# Altium footprint library ProgettoAgrifoodLibreriaPCB.PcbLib: 54 footprints (part 4 of 4)
Each footprint in its own frame and in the unit in brackets; x right, y up, seen from the top. Pads: shape width x height; smd on the part's side, far side on the other; paste and mask are expansions set on the pad; w line width, h text height; cw(c..) or ccw(c..) is an arc to the next point about the centre after c.
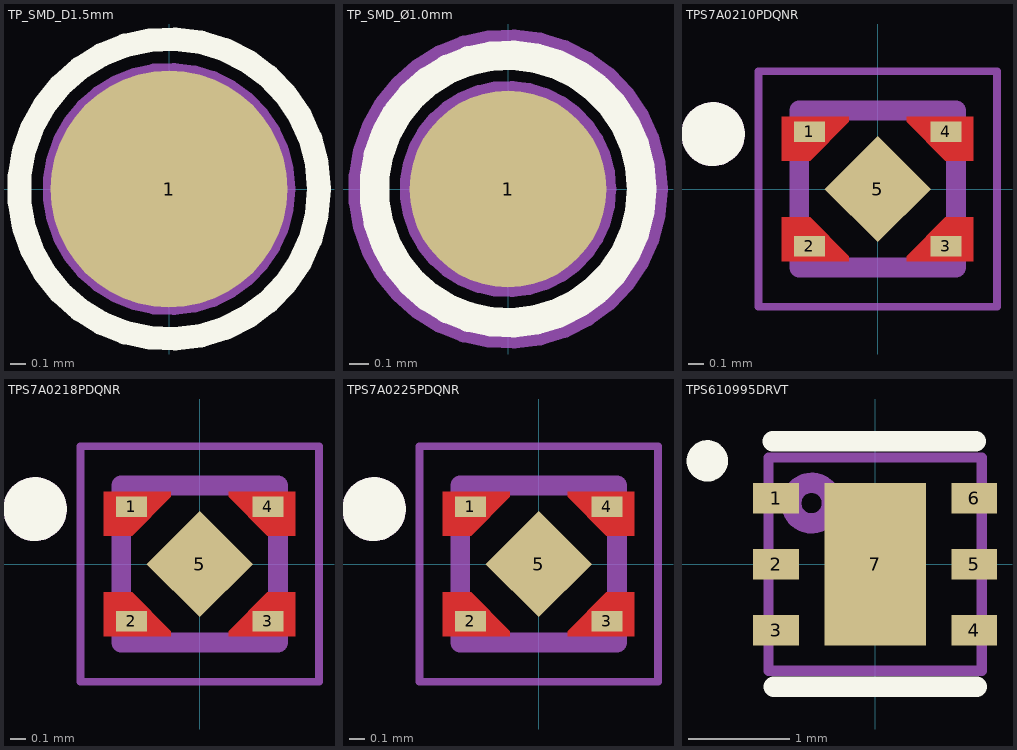
[diagram p3: the footprints below, top view; thin cyan lines are the x and y axes]

## TP_SMD_D1.5mm [mm]
pads (1):
  round 1.5 smd paste-5: 1(0,0)
Top Overlay:
  circle w0.15: c0,0 r0.95
Top Courtyard:
  circle w0.1: c0,0 r0.95
Top Assembly:
  circle w0.1: c0,0 r0.75
  text ".Designator" at -0.9,1.175 h0.38
3D body: height 0.05, standoff 0, extent -0.75,-0.75 0.75,0.75

## TP_SMD_Ø1.0mm [mm]
pads (1):
  round 1 smd paste-5: 1(0,0)
Top Overlay:
  circle w0.15: c0,0 r0.68
Top Courtyard:
  circle w0.1: c0,0 r0.762
Top Assembly:
  circle w0.1: c0,0 r0.5
  text ".Designator" at -0.633,0.918 h0.38

## TPS7A0210PDQNR [mm]
pads (5):
  rect 0.2x0.13 smd paste-1 mask+0: 1(-0.435,0.365) 2(-0.435,-0.365) 3(0.435,-0.365) 4(0.435,0.365)
  rect 0.48x0.48 smd rot 135 paste+0.002 mask+0.051: 5(0,0)
Top Layer:
  region: 0.61,-0.46 0.185,-0.46 0.185,-0.43 0.43,-0.18 0.61,-0.18
  region: 0.61,0.18 0.43,0.18 0.185,0.43 0.185,0.46 0.61,0.46
  region: -0.185,-0.43 -0.185,-0.46 -0.61,-0.46 -0.61,-0.18 -0.43,-0.18
  region: -0.185,0.43 -0.43,0.18 -0.61,0.18 -0.61,0.46 -0.185,0.46
Top Overlay:
  circle w0.203: c-1.05,0.35 r0.102
Top Paste:
  region: -0.605,0.191 -0.605,0.451 -0.205,0.451 -0.205,0.421 -0.435,0.191
  region: 0.601,-0.19 0.601,-0.45 0.201,-0.45 0.201,-0.42 0.431,-0.19
  region: -0.602,-0.192 -0.602,-0.452 -0.202,-0.452 -0.202,-0.422 -0.432,-0.192
  region: 0.603,0.189 0.603,0.45 0.203,0.45 0.203,0.42 0.434,0.189
Top Courtyard:
  lines w0.05: -0.76,-0.75 0.76,-0.75 0.76,0.75 -0.76,0.75 -0.76,-0.75
Top Assembly:
  circle w0.203: c-1.05,0.35 r0.102
  lines w0.127: -0.5,-0.5 0.5,-0.5 0.5,0.5 -0.5,0.5 -0.5,-0.5
  text ".Designator" at -0.809,0.982 h0.8
3D body "DQN0004A.stp": height 0.36, standoff 0, extent -0.5,-0.5 0.5,0.5

## TPS7A0218PDQNR [mm]
pads (5):
  rect 0.2x0.13 smd paste-1 mask+0: 1(-0.435,0.365) 2(-0.435,-0.365) 3(0.435,-0.365) 4(0.435,0.365)
  rect 0.48x0.48 smd rot 135 paste+0.002 mask+0.051: 5(0,0)
Top Layer:
  region: 0.61,-0.46 0.185,-0.46 0.185,-0.43 0.43,-0.18 0.61,-0.18
  region: 0.61,0.18 0.43,0.18 0.185,0.43 0.185,0.46 0.61,0.46
  region: -0.185,-0.43 -0.185,-0.46 -0.61,-0.46 -0.61,-0.18 -0.43,-0.18
  region: -0.185,0.43 -0.43,0.18 -0.61,0.18 -0.61,0.46 -0.185,0.46
Top Overlay:
  circle w0.203: c-1.05,0.35 r0.102
Top Paste:
  region: 0.604,-0.191 0.604,-0.45 0.204,-0.45 0.204,-0.42 0.433,-0.191
  region: -0.603,0.194 -0.603,0.454 -0.203,0.454 -0.203,0.424 -0.432,0.194
  region: 0.602,0.192 0.602,0.453 0.202,0.453 0.202,0.423 0.433,0.192
  region: -0.6,-0.192 -0.6,-0.453 -0.2,-0.453 -0.2,-0.423 -0.431,-0.192
Top Courtyard:
  lines w0.05: -0.76,-0.75 0.76,-0.75 0.76,0.75 -0.76,0.75 -0.76,-0.75
Top Assembly:
  circle w0.203: c-1.05,0.35 r0.102
  lines w0.127: -0.5,-0.5 -0.5,0.5 0.5,0.5 0.5,-0.5 -0.5,-0.5
  text ".Designator" at -0.662,0.875 h0.8
3D body "DQN0004A.stp": height 0.36, standoff 0, extent -0.5,-0.5 0.5,0.5

## TPS7A0225PDQNR [mm]
pads (5):
  rect 0.2x0.13 smd paste-1 mask+0: 1(-0.435,0.365) 2(-0.435,-0.365) 3(0.435,-0.365) 4(0.435,0.365)
  rect 0.48x0.48 smd rot 135 paste+0.002 mask+0.051: 5(0,0)
Top Layer:
  region: -0.185,0.43 -0.43,0.18 -0.61,0.18 -0.61,0.46 -0.185,0.46
  region: -0.185,-0.43 -0.185,-0.46 -0.61,-0.46 -0.61,-0.18 -0.43,-0.18
  region: 0.61,0.18 0.43,0.18 0.185,0.43 0.185,0.46 0.61,0.46
  region: 0.61,-0.46 0.185,-0.46 0.185,-0.43 0.43,-0.18 0.61,-0.18
Top Overlay:
  circle w0.203: c-1.05,0.35 r0.102
Top Paste:
  region: -0.603,0.195 -0.603,0.455 -0.203,0.455 -0.203,0.425 -0.432,0.195
  region: 0.601,-0.192 0.601,-0.452 0.201,-0.452 0.201,-0.422 0.431,-0.192
  region: -0.601,-0.191 -0.601,-0.452 -0.201,-0.452 -0.201,-0.422 -0.432,-0.191
  region: 0.605,0.193 0.605,0.454 0.205,0.454 0.205,0.424 0.435,0.193
Top Courtyard:
  lines w0.05: -0.76,-0.75 -0.76,0.75 0.76,0.75 0.76,-0.75 -0.76,-0.75
Top Assembly:
  circle w0.203: c-1.05,0.35 r0.102
  lines w0.127: -0.5,-0.5 0.5,-0.5 0.5,0.5 -0.5,0.5 -0.5,-0.5
  text ".Designator" at -0.662,0.875 h0.8
3D body "DQN0004A.stp": height 0.36, standoff 0, extent -0.5,-0.5 0.5,0.5

## TPS610995DRVT [mm]
pads (7):
  rect 0.45x0.3 smd paste+0 mask+0.07: 1(-0.975,0.65) 2(-0.975,0) 3(-0.975,-0.65) 4(0.975,-0.65) 5(0.975,0) 6(0.975,0.65)
  rect 1x1.6 smd paste-0.5 mask+0.07: 7(0,0)
Top Overlay:
  circle w0.203: c-1.651,1.016 r0.102
  lines w0.2: -1.009,1.209 0.991,1.209 ; -0.996,-1.208 1.004,-1.208
Top Paste:
  region: -0.499,0.139 -0.5,0.149 -0.5,0.751 -0.499,0.761 -0.496,0.77 -0.492,0.778 -0.486,0.786 -0.478,0.792 -0.47,0.796 -0.461,0.799 -0.451,0.8 0.451,0.8 0.461,0.799 0.47,0.796 0.478,0.792 0.486,0.786 0.492,0.778 0.496,0.77 0.499,0.761 0.5,0.751 0.5,0.149 0.499,0.139 0.496,0.13 0.492,0.122 0.486,0.114 0.478,0.108 0.47,0.104 0.461,0.101 0.451,0.1 -0.451,0.1 -0.461,0.101 -0.47,0.104 -0.478,0.108 -0.486,0.114 -0.492,0.122 -0.496,0.13
  region: -0.499,-0.761 -0.5,-0.751 -0.5,-0.149 -0.499,-0.139 -0.496,-0.13 -0.492,-0.122 -0.486,-0.114 -0.478,-0.108 -0.47,-0.104 -0.461,-0.101 -0.451,-0.1 0.451,-0.1 0.461,-0.101 0.47,-0.104 0.478,-0.108 0.486,-0.114 0.492,-0.122 0.496,-0.13 0.499,-0.139 0.5,-0.149 0.5,-0.751 0.499,-0.761 0.496,-0.77 0.492,-0.778 0.486,-0.786 0.478,-0.792 0.47,-0.796 0.461,-0.799 0.451,-0.8 -0.451,-0.8 -0.461,-0.799 -0.47,-0.796 -0.478,-0.792 -0.486,-0.786 -0.492,-0.778 -0.496,-0.77
Top Assembly:
  circle w0.2: c-0.625,0.6 r0.2
  lines w0.1: -1.05,-1.05 1.05,-1.05 1.05,1.05 -1.05,1.05 -1.05,-1.05
  text ".Designator" at -1.27,1.778 h1
3D body: height 0.25, standoff 0, extent 0,0 0.254,0.254
3D body "DRV0006A.stp": height 0.8, standoff 0, extent -1,-1 1,1